# Altium footprint library connector.PcbLib: 172 footprints (part 9 of 11)
Each footprint in its own frame and in the unit in brackets; x right, y up, seen from the top. Pads: shape width x height; smd on the part's side, far side on the other; paste and mask are expansions set on the pad; w line width, h text height; cw(c..) or ccw(c..) is an arc to the next point about the centre after c.
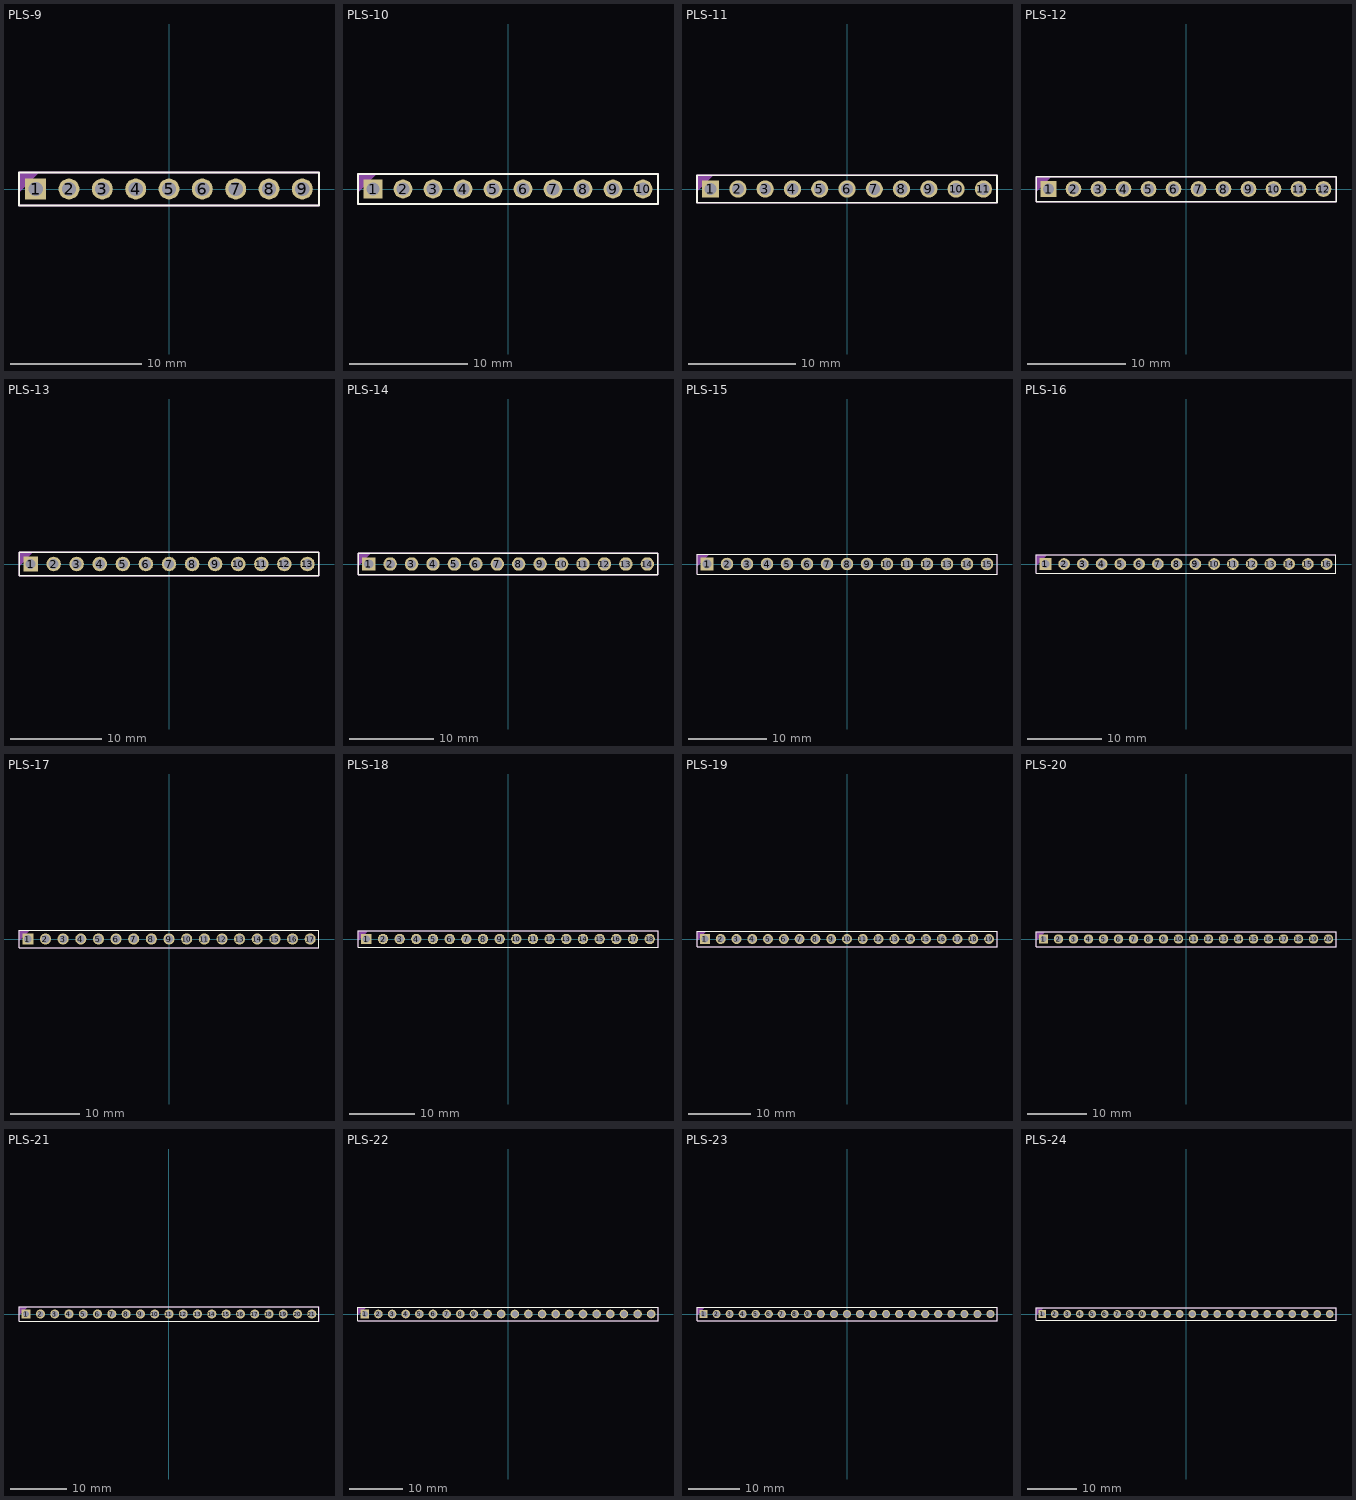
[diagram p8: the footprints below, top view; thin cyan lines are the x and y axes]

## PLS-9 [mm]
pads (9):
  rect 1.6x1.6 hole 1.1: 1(-10.16,0)
  round 1.6 hole 1.1: 2(-7.62,0) 3(-5.08,0) 4(-2.54,0) 5(0,0) 6(2.54,0) 7(5.08,0) 8(7.62,0) 9(10.16,0)
Top Overlay:
  lines w0.15: -11.43,-1.27 -11.43,1.27 11.43,1.27 11.43,-1.27 -11.43,-1.27
Mechanical 29:
  region: -11.43,1.27 -9.906,1.27 -11.43,-0.254
  lines w0.15: -11.43,-1.27 11.43,-1.27 11.43,1.27 -11.43,1.27 -11.43,-1.27
  text ".Designator" at -3.5,-0.3 h1
3D body "PLS-1.STEP": height 8.5, standoff -3, extent -11.43,-1.27 -8.89,1.27
3D body "PLS-1.STEP": height 8.5, standoff -3, extent -8.89,-1.27 -6.35,1.27
3D body "PLS-1.STEP": height 8.5, standoff -3, extent -6.35,-1.27 -3.81,1.27
3D body "PLS-1.STEP": height 8.5, standoff -3, extent -3.81,-1.27 -1.27,1.27
3D body "PLS-1.STEP": height 8.5, standoff -3, extent -1.27,-1.27 1.27,1.27
3D body "PLS-1.STEP": height 8.5, standoff -3, extent 1.27,-1.27 3.81,1.27
3D body "PLS-1.STEP": height 8.5, standoff -3, extent 3.81,-1.27 6.35,1.27
3D body "PLS-1.STEP": height 8.5, standoff -3, extent 6.35,-1.27 8.89,1.27
3D body "PLS-1.STEP": height 8.5, standoff -3, extent 8.89,-1.27 11.43,1.27

## PLS-10 [mm]
pads (10):
  rect 1.6x1.6 hole 1.1: 1(-11.43,0)
  round 1.6 hole 1.1: 2(-8.89,0) 3(-6.35,0) 4(-3.81,0) 5(-1.27,0) 6(1.27,0) 7(3.81,0) 8(6.35,0) 9(8.89,0) 10(11.43,0)
Top Overlay:
  lines w0.15: -12.7,-1.27 12.7,-1.27 12.7,1.27 -12.7,1.27 -12.7,-1.27
Mechanical 29:
  region: -12.7,1.27 -11.176,1.27 -12.7,-0.254
  lines w0.15: -12.7,-1.27 -12.7,1.27 12.7,1.27 12.7,-1.27 -12.7,-1.27
  text ".Designator" at -3.5,-0.8 h1
3D body "PLS-1.STEP": height 8.5, standoff -3, extent 10.16,-1.27 12.7,1.27
3D body "PLS-1.STEP": height 8.5, standoff -3, extent 7.62,-1.27 10.16,1.27
3D body "PLS-1.STEP": height 8.5, standoff -3, extent 5.08,-1.27 7.62,1.27
3D body "PLS-1.STEP": height 8.5, standoff -3, extent 2.54,-1.27 5.08,1.27
3D body "PLS-1.STEP": height 8.5, standoff -3, extent 0,-1.27 2.54,1.27
3D body "PLS-1.STEP": height 8.5, standoff -3, extent -2.54,-1.27 0,1.27
3D body "PLS-1.STEP": height 8.5, standoff -3, extent -5.08,-1.27 -2.54,1.27
3D body "PLS-1.STEP": height 8.5, standoff -3, extent -7.62,-1.27 -5.08,1.27
3D body "PLS-1.STEP": height 8.5, standoff -3, extent -10.16,-1.27 -7.62,1.27
3D body "PLS-1.STEP": height 8.5, standoff -3, extent -12.7,-1.27 -10.16,1.27

## PLS-11 [mm]
pads (11):
  rect 1.6x1.6 hole 1.1: 1(-12.7,0)
  round 1.6 hole 1.1: 2(-10.16,0) 3(-7.62,0) 4(-5.08,0) 5(-2.54,0) 6(0,0) 7(2.54,0) 8(5.08,0) 9(7.62,0) 10(10.16,0) 11(12.7,0)
Top Overlay:
  lines w0.15: -13.97,-1.27 13.97,-1.27 13.97,1.27 -13.97,1.27 -13.97,-1.27
Mechanical 29:
  region: -13.97,1.27 -12.446,1.27 -13.97,-0.254
  lines w0.15: -13.97,-1.27 -13.97,1.27 13.97,1.27 13.97,-1.27 -13.97,-1.27
  text ".Designator" at -3.5,-0.3 h1
3D body "PLS-1.STEP": height 8.5, standoff -3, extent 11.43,-1.27 13.97,1.27
3D body "PLS-1.STEP": height 8.5, standoff -3, extent 8.89,-1.27 11.43,1.27
3D body "PLS-1.STEP": height 8.5, standoff -3, extent 6.35,-1.27 8.89,1.27
3D body "PLS-1.STEP": height 8.5, standoff -3, extent 3.81,-1.27 6.35,1.27
3D body "PLS-1.STEP": height 8.5, standoff -3, extent 1.27,-1.27 3.81,1.27
3D body "PLS-1.STEP": height 8.5, standoff -3, extent -1.27,-1.27 1.27,1.27
3D body "PLS-1.STEP": height 8.5, standoff -3, extent -3.81,-1.27 -1.27,1.27
3D body "PLS-1.STEP": height 8.5, standoff -3, extent -6.35,-1.27 -3.81,1.27
3D body "PLS-1.STEP": height 8.5, standoff -3, extent -8.89,-1.27 -6.35,1.27
3D body "PLS-1.STEP": height 8.5, standoff -3, extent -11.43,-1.27 -8.89,1.27
3D body "PLS-1.STEP": height 8.5, standoff -3, extent -13.97,-1.27 -11.43,1.27

## PLS-12 [mm]
pads (12):
  rect 1.6x1.6 hole 1.1: 1(-13.97,0)
  round 1.6 hole 1.1: 2(-11.43,0) 3(-8.89,0) 4(-6.35,0) 5(-3.81,0) 6(-1.27,0) 7(1.27,0) 8(3.81,0) 9(6.35,0) 10(8.89,0) 11(11.43,0) 12(13.97,0)
Top Overlay:
  lines w0.15: -15.24,-1.27 15.24,-1.27 15.24,1.27 -15.24,1.27 -15.24,-1.27
Mechanical 29:
  region: -15.24,1.27 -13.716,1.27 -15.24,-0.254
  lines w0.15: -15.24,-1.27 -15.24,1.27 15.24,1.27 15.24,-1.27 -15.24,-1.27
  text ".Designator" at -3.5,-0.3 h1
3D body "PLS-1.STEP": height 8.5, standoff -3, extent 12.7,-1.27 15.24,1.27
3D body "PLS-1.STEP": height 8.5, standoff -3, extent 10.16,-1.27 12.7,1.27
3D body "PLS-1.STEP": height 8.5, standoff -3, extent 7.62,-1.27 10.16,1.27
3D body "PLS-1.STEP": height 8.5, standoff -3, extent 5.08,-1.27 7.62,1.27
3D body "PLS-1.STEP": height 8.5, standoff -3, extent 2.54,-1.27 5.08,1.27
3D body "PLS-1.STEP": height 8.5, standoff -3, extent 0,-1.27 2.54,1.27
3D body "PLS-1.STEP": height 8.5, standoff -3, extent -2.54,-1.27 0,1.27
3D body "PLS-1.STEP": height 8.5, standoff -3, extent -5.08,-1.27 -2.54,1.27
3D body "PLS-1.STEP": height 8.5, standoff -3, extent -7.62,-1.27 -5.08,1.27
3D body "PLS-1.STEP": height 8.5, standoff -3, extent -10.16,-1.27 -7.62,1.27
3D body "PLS-1.STEP": height 8.5, standoff -3, extent -12.7,-1.27 -10.16,1.27
3D body "PLS-1.STEP": height 8.5, standoff -3, extent -15.24,-1.27 -12.7,1.27

## PLS-13 [mm]
pads (13):
  rect 1.6x1.6 hole 1.1: 1(-15.24,0)
  round 1.6 hole 1.1: 2(-12.7,0) 3(-10.16,0) 4(-7.62,0) 5(-5.08,0) 6(-2.54,0) 7(0,0) 8(2.54,0) 9(5.08,0) 10(7.62,0) 11(10.16,0) 12(12.7,0) 13(15.24,0)
Top Overlay:
  lines w0.15: -16.51,-1.27 16.51,-1.27 16.51,1.27 -16.51,1.27 -16.51,-1.27
Mechanical 29:
  region: -16.51,1.27 -14.986,1.27 -16.51,-0.254
  lines w0.15: -16.51,-1.27 -16.51,1.27 16.51,1.27 16.51,-1.27 -16.51,-1.27
  text ".Designator" at -3.5,-0.3 h1
3D body "PLS-1.STEP": height 8.5, standoff -3, extent 13.97,-1.27 16.51,1.27
3D body "PLS-1.STEP": height 8.5, standoff -3, extent 11.43,-1.27 13.97,1.27
3D body "PLS-1.STEP": height 8.5, standoff -3, extent 8.89,-1.27 11.43,1.27
3D body "PLS-1.STEP": height 8.5, standoff -3, extent 6.35,-1.27 8.89,1.27
3D body "PLS-1.STEP": height 8.5, standoff -3, extent 3.81,-1.27 6.35,1.27
3D body "PLS-1.STEP": height 8.5, standoff -3, extent 1.27,-1.27 3.81,1.27
3D body "PLS-1.STEP": height 8.5, standoff -3, extent -1.27,-1.27 1.27,1.27
3D body "PLS-1.STEP": height 8.5, standoff -3, extent -3.81,-1.27 -1.27,1.27
3D body "PLS-1.STEP": height 8.5, standoff -3, extent -6.35,-1.27 -3.81,1.27
3D body "PLS-1.STEP": height 8.5, standoff -3, extent -8.89,-1.27 -6.35,1.27
3D body "PLS-1.STEP": height 8.5, standoff -3, extent -11.43,-1.27 -8.89,1.27
3D body "PLS-1.STEP": height 8.5, standoff -3, extent -13.97,-1.27 -11.43,1.27
3D body "PLS-1.STEP": height 8.5, standoff -3, extent -16.51,-1.27 -13.97,1.27

## PLS-14 [mm]
pads (14):
  rect 1.6x1.6 hole 1.1: 1(-16.51,0)
  round 1.6 hole 1.1: 2(-13.97,0) 3(-11.43,0) 4(-8.89,0) 5(-6.35,0) 6(-3.81,0) 7(-1.27,0) 8(1.27,0) 9(3.81,0) 10(6.35,0) 11(8.89,0) 12(11.43,0) 13(13.97,0) 14(16.51,0)
Top Overlay:
  lines w0.15: -17.78,-1.27 -17.78,1.27 17.78,1.27 17.78,-1.27 -17.78,-1.27
Mechanical 29:
  region: -17.78,1.27 -16.256,1.27 -17.78,-0.254
  lines w0.15: -17.78,-1.27 17.78,-1.27 17.78,1.27 -17.78,1.27 -17.78,-1.27
  text ".Designator" at -3.5,-0.3 h1
3D body "PLS-1.STEP": height 8.5, standoff -3, extent -17.78,-1.27 -15.24,1.27
3D body "PLS-1.STEP": height 8.5, standoff -3, extent -15.24,-1.27 -12.7,1.27
3D body "PLS-1.STEP": height 8.5, standoff -3, extent -12.7,-1.27 -10.16,1.27
3D body "PLS-1.STEP": height 8.5, standoff -3, extent -10.16,-1.27 -7.62,1.27
3D body "PLS-1.STEP": height 8.5, standoff -3, extent -7.62,-1.27 -5.08,1.27
3D body "PLS-1.STEP": height 8.5, standoff -3, extent -5.08,-1.27 -2.54,1.27
3D body "PLS-1.STEP": height 8.5, standoff -3, extent -2.54,-1.27 0,1.27
3D body "PLS-1.STEP": height 8.5, standoff -3, extent 0,-1.27 2.54,1.27
3D body "PLS-1.STEP": height 8.5, standoff -3, extent 2.54,-1.27 5.08,1.27
3D body "PLS-1.STEP": height 8.5, standoff -3, extent 5.08,-1.27 7.62,1.27
3D body "PLS-1.STEP": height 8.5, standoff -3, extent 7.62,-1.27 10.16,1.27
3D body "PLS-1.STEP": height 8.5, standoff -3, extent 10.16,-1.27 12.7,1.27
3D body "PLS-1.STEP": height 8.5, standoff -3, extent 12.7,-1.27 15.24,1.27
3D body "PLS-1.STEP": height 8.5, standoff -3, extent 15.24,-1.27 17.78,1.27

## PLS-15 [mm]
pads (15):
  rect 1.6x1.6 hole 1.1: 1(-17.78,0)
  round 1.6 hole 1.1: 2(-15.24,0) 3(-12.7,0) 4(-10.16,0) 5(-7.62,0) 6(-5.08,0) 7(-2.54,0) 8(0,0) 9(2.54,0) 10(5.08,0) 11(7.62,0) 12(10.16,0) 13(12.7,0) 14(15.24,0) 15(17.78,0)
Top Overlay:
  lines w0.15: -19.05,-1.27 -19.05,1.27 19.05,1.27 19.05,-1.27 -19.05,-1.27
Mechanical 29:
  region: -19.05,1.27 -17.526,1.27 -19.05,-0.254
  lines w0.15: -19.05,-1.27 19.05,-1.27 19.05,1.27 -19.05,1.27 -19.05,-1.27
  text ".Designator" at -3.5,-0.3 h1
3D body "PLS-1.STEP": height 8.5, standoff -3, extent -19.05,-1.27 -16.51,1.27
3D body "PLS-1.STEP": height 8.5, standoff -3, extent -16.51,-1.27 -13.97,1.27
3D body "PLS-1.STEP": height 8.5, standoff -3, extent -13.97,-1.27 -11.43,1.27
3D body "PLS-1.STEP": height 8.5, standoff -3, extent -11.43,-1.27 -8.89,1.27
3D body "PLS-1.STEP": height 8.5, standoff -3, extent -8.89,-1.27 -6.35,1.27
3D body "PLS-1.STEP": height 8.5, standoff -3, extent -6.35,-1.27 -3.81,1.27
3D body "PLS-1.STEP": height 8.5, standoff -3, extent -3.81,-1.27 -1.27,1.27
3D body "PLS-1.STEP": height 8.5, standoff -3, extent -1.27,-1.27 1.27,1.27
3D body "PLS-1.STEP": height 8.5, standoff -3, extent 1.27,-1.27 3.81,1.27
3D body "PLS-1.STEP": height 8.5, standoff -3, extent 3.81,-1.27 6.35,1.27
3D body "PLS-1.STEP": height 8.5, standoff -3, extent 6.35,-1.27 8.89,1.27
3D body "PLS-1.STEP": height 8.5, standoff -3, extent 8.89,-1.27 11.43,1.27
3D body "PLS-1.STEP": height 8.5, standoff -3, extent 11.43,-1.27 13.97,1.27
3D body "PLS-1.STEP": height 8.5, standoff -3, extent 13.97,-1.27 16.51,1.27
3D body "PLS-1.STEP": height 8.5, standoff -3, extent 16.51,-1.27 19.05,1.27

## PLS-16 [mm]
pads (16):
  rect 1.6x1.6 hole 1.1: 1(-19.05,0)
  round 1.6 hole 1.1: 2(-16.51,0) 3(-13.97,0) 4(-11.43,0) 5(-8.89,0) 6(-6.35,0) 7(-3.81,0) 8(-1.27,0) 9(1.27,0) 10(3.81,0) 11(6.35,0) 12(8.89,0) 13(11.43,0) 14(13.97,0) 15(16.51,0) 16(19.05,0)
Top Overlay:
  lines w0.15: -20.32,-1.27 20.32,-1.27 20.32,1.27 -20.32,1.27 -20.32,-1.27
Mechanical 29:
  region: -20.32,1.27 -18.796,1.27 -20.32,-0.254
  lines w0.15: -20.32,-1.27 -20.32,1.27 20.32,1.27 20.32,-1.27 -20.32,-1.27
  text ".Designator" at -3.5,-0.3 h1
3D body "PLS-1.STEP": height 8.5, standoff -3, extent 17.78,-1.27 20.32,1.27
3D body "PLS-1.STEP": height 8.5, standoff -3, extent 15.24,-1.27 17.78,1.27
3D body "PLS-1.STEP": height 8.5, standoff -3, extent 12.7,-1.27 15.24,1.27
3D body "PLS-1.STEP": height 8.5, standoff -3, extent 10.16,-1.27 12.7,1.27
3D body "PLS-1.STEP": height 8.5, standoff -3, extent 7.62,-1.27 10.16,1.27
3D body "PLS-1.STEP": height 8.5, standoff -3, extent 5.08,-1.27 7.62,1.27
3D body "PLS-1.STEP": height 8.5, standoff -3, extent 2.54,-1.27 5.08,1.27
3D body "PLS-1.STEP": height 8.5, standoff -3, extent 0,-1.27 2.54,1.27
3D body "PLS-1.STEP": height 8.5, standoff -3, extent -2.54,-1.27 0,1.27
3D body "PLS-1.STEP": height 8.5, standoff -3, extent -5.08,-1.27 -2.54,1.27
3D body "PLS-1.STEP": height 8.5, standoff -3, extent -7.62,-1.27 -5.08,1.27
3D body "PLS-1.STEP": height 8.5, standoff -3, extent -10.16,-1.27 -7.62,1.27
3D body "PLS-1.STEP": height 8.5, standoff -3, extent -12.7,-1.27 -10.16,1.27
3D body "PLS-1.STEP": height 8.5, standoff -3, extent -15.24,-1.27 -12.7,1.27
3D body "PLS-1.STEP": height 8.5, standoff -3, extent -17.78,-1.27 -15.24,1.27
3D body "PLS-1.STEP": height 8.5, standoff -3, extent -20.32,-1.27 -17.78,1.27

## PLS-17 [mm]
pads (17):
  rect 1.6x1.6 hole 1.1: 1(-20.32,0)
  round 1.6 hole 1.1: 2(-17.78,0) 3(-15.24,0) 4(-12.7,0) 5(-10.16,0) 6(-7.62,0) 7(-5.08,0) 8(-2.54,0) 9(0,0) 10(2.54,0) 11(5.08,0) 12(7.62,0) 13(10.16,0) 14(12.7,0) 15(15.24,0) 16(17.78,0) 17(20.32,0)
Top Overlay:
  lines w0.15: -21.59,-1.27 21.59,-1.27 21.59,1.27 -21.59,1.27 -21.59,-1.27
Mechanical 29:
  region: -21.59,1.27 -20.066,1.27 -21.59,-0.254
  lines w0.15: -21.59,-1.27 -21.59,1.27 21.59,1.27 21.59,-1.27 -21.59,-1.27
  text ".Designator" at -3.5,-0.3 h1
3D body "PLS-1.STEP": height 8.5, standoff -3, extent 19.05,-1.27 21.59,1.27
3D body "PLS-1.STEP": height 8.5, standoff -3, extent 16.51,-1.27 19.05,1.27
3D body "PLS-1.STEP": height 8.5, standoff -3, extent 13.97,-1.27 16.51,1.27
3D body "PLS-1.STEP": height 8.5, standoff -3, extent 11.43,-1.27 13.97,1.27
3D body "PLS-1.STEP": height 8.5, standoff -3, extent 8.89,-1.27 11.43,1.27
3D body "PLS-1.STEP": height 8.5, standoff -3, extent 6.35,-1.27 8.89,1.27
3D body "PLS-1.STEP": height 8.5, standoff -3, extent 3.81,-1.27 6.35,1.27
3D body "PLS-1.STEP": height 8.5, standoff -3, extent 1.27,-1.27 3.81,1.27
3D body "PLS-1.STEP": height 8.5, standoff -3, extent -1.27,-1.27 1.27,1.27
3D body "PLS-1.STEP": height 8.5, standoff -3, extent -3.81,-1.27 -1.27,1.27
3D body "PLS-1.STEP": height 8.5, standoff -3, extent -6.35,-1.27 -3.81,1.27
3D body "PLS-1.STEP": height 8.5, standoff -3, extent -8.89,-1.27 -6.35,1.27
3D body "PLS-1.STEP": height 8.5, standoff -3, extent -11.43,-1.27 -8.89,1.27
3D body "PLS-1.STEP": height 8.5, standoff -3, extent -13.97,-1.27 -11.43,1.27
3D body "PLS-1.STEP": height 8.5, standoff -3, extent -16.51,-1.27 -13.97,1.27
3D body "PLS-1.STEP": height 8.5, standoff -3, extent -19.05,-1.27 -16.51,1.27
3D body "PLS-1.STEP": height 8.5, standoff -3, extent -21.59,-1.27 -19.05,1.27

## PLS-18 [mm]
pads (18):
  rect 1.6x1.6 hole 1.1: 1(-21.59,0)
  round 1.6 hole 1.1: 2(-19.05,0) 3(-16.51,0) 4(-13.97,0) 5(-11.43,0) 6(-8.89,0) 7(-6.35,0) 8(-3.81,0) 9(-1.27,0) 10(1.27,0) 11(3.81,0) 12(6.35,0) 13(8.89,0) 14(11.43,0) 15(13.97,0) 16(16.51,0) 17(19.05,0) 18(21.59,0)
Top Overlay:
  lines w0.15: -22.86,-1.27 22.86,-1.27 22.86,1.27 -22.86,1.27 -22.86,-1.27
Mechanical 29:
  region: -22.86,1.27 -21.336,1.27 -22.86,-0.254
  lines w0.15: -22.86,-1.27 -22.86,1.27 22.86,1.27 22.86,-1.27 -22.86,-1.27
  text ".Designator" at -3.5,-0.3 h1
3D body "PLS-1.STEP": height 8.5, standoff -3, extent 20.32,-1.27 22.86,1.27
3D body "PLS-1.STEP": height 8.5, standoff -3, extent 17.78,-1.27 20.32,1.27
3D body "PLS-1.STEP": height 8.5, standoff -3, extent 15.24,-1.27 17.78,1.27
3D body "PLS-1.STEP": height 8.5, standoff -3, extent 12.7,-1.27 15.24,1.27
3D body "PLS-1.STEP": height 8.5, standoff -3, extent 10.16,-1.27 12.7,1.27
3D body "PLS-1.STEP": height 8.5, standoff -3, extent 7.62,-1.27 10.16,1.27
3D body "PLS-1.STEP": height 8.5, standoff -3, extent 5.08,-1.27 7.62,1.27
3D body "PLS-1.STEP": height 8.5, standoff -3, extent 2.54,-1.27 5.08,1.27
3D body "PLS-1.STEP": height 8.5, standoff -3, extent 0,-1.27 2.54,1.27
3D body "PLS-1.STEP": height 8.5, standoff -3, extent -2.54,-1.27 0,1.27
3D body "PLS-1.STEP": height 8.5, standoff -3, extent -5.08,-1.27 -2.54,1.27
3D body "PLS-1.STEP": height 8.5, standoff -3, extent -7.62,-1.27 -5.08,1.27
3D body "PLS-1.STEP": height 8.5, standoff -3, extent -10.16,-1.27 -7.62,1.27
3D body "PLS-1.STEP": height 8.5, standoff -3, extent -12.7,-1.27 -10.16,1.27
3D body "PLS-1.STEP": height 8.5, standoff -3, extent -15.24,-1.27 -12.7,1.27
3D body "PLS-1.STEP": height 8.5, standoff -3, extent -17.78,-1.27 -15.24,1.27
3D body "PLS-1.STEP": height 8.5, standoff -3, extent -20.32,-1.27 -17.78,1.27
3D body "PLS-1.STEP": height 8.5, standoff -3, extent -22.86,-1.27 -20.32,1.27

## PLS-19 [mm]
pads (19):
  rect 1.6x1.6 hole 1.1: 1(-22.86,0)
  round 1.6 hole 1.1: 2(-20.32,0) 3(-17.78,0) 4(-15.24,0) 5(-12.7,0) 6(-10.16,0) 7(-7.62,0) 8(-5.08,0) 9(-2.54,0) 10(0,0) 11(2.54,0) 12(5.08,0) 13(7.62,0) 14(10.16,0) 15(12.7,0) 16(15.24,0) 17(17.78,0) 18(20.32,0) 19(22.86,0)
Top Overlay:
  lines w0.15: -24.13,-1.27 -24.13,1.27 24.13,1.27 24.13,-1.27 -24.13,-1.27
Mechanical 29:
  region: -24.13,1.27 -22.606,1.27 -24.13,-0.254
  lines w0.15: -24.13,-1.27 24.13,-1.27 24.13,1.27 -24.13,1.27 -24.13,-1.27
  text ".Designator" at -3.5,-0.3 h1
3D body "PLS-1.STEP": height 8.5, standoff -3, extent -24.13,-1.27 -21.59,1.27
3D body "PLS-1.STEP": height 8.5, standoff -3, extent -21.59,-1.27 -19.05,1.27
3D body "PLS-1.STEP": height 8.5, standoff -3, extent -19.05,-1.27 -16.51,1.27
3D body "PLS-1.STEP": height 8.5, standoff -3, extent -16.51,-1.27 -13.97,1.27
3D body "PLS-1.STEP": height 8.5, standoff -3, extent -13.97,-1.27 -11.43,1.27
3D body "PLS-1.STEP": height 8.5, standoff -3, extent -11.43,-1.27 -8.89,1.27
3D body "PLS-1.STEP": height 8.5, standoff -3, extent -8.89,-1.27 -6.35,1.27
3D body "PLS-1.STEP": height 8.5, standoff -3, extent -6.35,-1.27 -3.81,1.27
3D body "PLS-1.STEP": height 8.5, standoff -3, extent -3.81,-1.27 -1.27,1.27
3D body "PLS-1.STEP": height 8.5, standoff -3, extent -1.27,-1.27 1.27,1.27
3D body "PLS-1.STEP": height 8.5, standoff -3, extent 1.27,-1.27 3.81,1.27
3D body "PLS-1.STEP": height 8.5, standoff -3, extent 3.81,-1.27 6.35,1.27
3D body "PLS-1.STEP": height 8.5, standoff -3, extent 6.35,-1.27 8.89,1.27
3D body "PLS-1.STEP": height 8.5, standoff -3, extent 8.89,-1.27 11.43,1.27
3D body "PLS-1.STEP": height 8.5, standoff -3, extent 11.43,-1.27 13.97,1.27
3D body "PLS-1.STEP": height 8.5, standoff -3, extent 13.97,-1.27 16.51,1.27
3D body "PLS-1.STEP": height 8.5, standoff -3, extent 16.51,-1.27 19.05,1.27
3D body "PLS-1.STEP": height 8.5, standoff -3, extent 19.05,-1.27 21.59,1.27
3D body "PLS-1.STEP": height 8.5, standoff -3, extent 21.59,-1.27 24.13,1.27

## PLS-20 [mm]
pads (20):
  rect 1.6x1.6 hole 1.1: 1(-24.13,0)
  round 1.6 hole 1.1: 2(-21.59,0) 3(-19.05,0) 4(-16.51,0) 5(-13.97,0) 6(-11.43,0) 7(-8.89,0) 8(-6.35,0) 9(-3.81,0) 10(-1.27,0) 11(1.27,0) 12(3.81,0) 13(6.35,0) 14(8.89,0) 15(11.43,0) 16(13.97,0) 17(16.51,0) 18(19.05,0) 19(21.59,0) 20(24.13,0)
Top Overlay:
  lines w0.15: -25.4,-1.27 25.4,-1.27 25.4,1.27 -25.4,1.27 -25.4,-1.27
Mechanical 29:
  region: -25.4,1.27 -23.876,1.27 -25.4,-0.254
  lines w0.15: -25.4,-1.27 -25.4,1.27 25.4,1.27 25.4,-1.27 -25.4,-1.27
  text ".Designator" at -3.5,-0.3 h1
3D body "PLS-1.STEP": height 8.5, standoff -3, extent 22.86,-1.27 25.4,1.27
3D body "PLS-1.STEP": height 8.5, standoff -3, extent 20.32,-1.27 22.86,1.27
3D body "PLS-1.STEP": height 8.5, standoff -3, extent 17.78,-1.27 20.32,1.27
3D body "PLS-1.STEP": height 8.5, standoff -3, extent 15.24,-1.27 17.78,1.27
3D body "PLS-1.STEP": height 8.5, standoff -3, extent 12.7,-1.27 15.24,1.27
3D body "PLS-1.STEP": height 8.5, standoff -3, extent 10.16,-1.27 12.7,1.27
3D body "PLS-1.STEP": height 8.5, standoff -3, extent 7.62,-1.27 10.16,1.27
3D body "PLS-1.STEP": height 8.5, standoff -3, extent 5.08,-1.27 7.62,1.27
3D body "PLS-1.STEP": height 8.5, standoff -3, extent 2.54,-1.27 5.08,1.27
3D body "PLS-1.STEP": height 8.5, standoff -3, extent 0,-1.27 2.54,1.27
3D body "PLS-1.STEP": height 8.5, standoff -3, extent -2.54,-1.27 0,1.27
3D body "PLS-1.STEP": height 8.5, standoff -3, extent -5.08,-1.27 -2.54,1.27
3D body "PLS-1.STEP": height 8.5, standoff -3, extent -7.62,-1.27 -5.08,1.27
3D body "PLS-1.STEP": height 8.5, standoff -3, extent -10.16,-1.27 -7.62,1.27
3D body "PLS-1.STEP": height 8.5, standoff -3, extent -12.7,-1.27 -10.16,1.27
3D body "PLS-1.STEP": height 8.5, standoff -3, extent -15.24,-1.27 -12.7,1.27
3D body "PLS-1.STEP": height 8.5, standoff -3, extent -17.78,-1.27 -15.24,1.27
3D body "PLS-1.STEP": height 8.5, standoff -3, extent -20.32,-1.27 -17.78,1.27
3D body "PLS-1.STEP": height 8.5, standoff -3, extent -22.86,-1.27 -20.32,1.27
3D body "PLS-1.STEP": height 8.5, standoff -3, extent -25.4,-1.27 -22.86,1.27

## PLS-21 [mm]
pads (21):
  rect 1.6x1.6 hole 1.1: 1(-25.4,0)
  round 1.6 hole 1.1: 2(-22.86,0) 3(-20.32,0) 4(-17.78,0) 5(-15.24,0) 6(-12.7,0) 7(-10.16,0) 8(-7.62,0) 9(-5.08,0) 10(-2.54,0) 11(0,0) 12(2.54,0) 13(5.08,0) 14(7.62,0) 15(10.16,0) 16(12.7,0) 17(15.24,0) 18(17.78,0) 19(20.32,0) 20(22.86,0) 21(25.4,0)
Top Overlay:
  lines w0.15: -26.67,-1.27 26.67,-1.27 26.67,1.27 -26.67,1.27 -26.67,-1.27
Mechanical 29:
  region: -26.67,1.27 -25.146,1.27 -26.67,-0.254
  lines w0.15: -26.67,-1.27 -26.67,1.27 26.67,1.27 26.67,-1.27 -26.67,-1.27
  text ".Designator" at -3.5,-0.3 h1
3D body "PLS-1.STEP": height 8.5, standoff -3, extent 24.13,-1.27 26.67,1.27
3D body "PLS-1.STEP": height 8.5, standoff -3, extent 21.59,-1.27 24.13,1.27
3D body "PLS-1.STEP": height 8.5, standoff -3, extent 19.05,-1.27 21.59,1.27
3D body "PLS-1.STEP": height 8.5, standoff -3, extent 16.51,-1.27 19.05,1.27
3D body "PLS-1.STEP": height 8.5, standoff -3, extent 13.97,-1.27 16.51,1.27
3D body "PLS-1.STEP": height 8.5, standoff -3, extent 11.43,-1.27 13.97,1.27
3D body "PLS-1.STEP": height 8.5, standoff -3, extent 8.89,-1.27 11.43,1.27
3D body "PLS-1.STEP": height 8.5, standoff -3, extent 6.35,-1.27 8.89,1.27
3D body "PLS-1.STEP": height 8.5, standoff -3, extent 3.81,-1.27 6.35,1.27
3D body "PLS-1.STEP": height 8.5, standoff -3, extent 1.27,-1.27 3.81,1.27
3D body "PLS-1.STEP": height 8.5, standoff -3, extent -1.27,-1.27 1.27,1.27
3D body "PLS-1.STEP": height 8.5, standoff -3, extent -3.81,-1.27 -1.27,1.27
3D body "PLS-1.STEP": height 8.5, standoff -3, extent -6.35,-1.27 -3.81,1.27
3D body "PLS-1.STEP": height 8.5, standoff -3, extent -8.89,-1.27 -6.35,1.27
3D body "PLS-1.STEP": height 8.5, standoff -3, extent -11.43,-1.27 -8.89,1.27
3D body "PLS-1.STEP": height 8.5, standoff -3, extent -13.97,-1.27 -11.43,1.27
3D body "PLS-1.STEP": height 8.5, standoff -3, extent -16.51,-1.27 -13.97,1.27
3D body "PLS-1.STEP": height 8.5, standoff -3, extent -19.05,-1.27 -16.51,1.27
3D body "PLS-1.STEP": height 8.5, standoff -3, extent -21.59,-1.27 -19.05,1.27
3D body "PLS-1.STEP": height 8.5, standoff -3, extent -24.13,-1.27 -21.59,1.27
3D body "PLS-1.STEP": height 8.5, standoff -3, extent -26.67,-1.27 -24.13,1.27

## PLS-22 [mm]
pads (22):
  rect 1.6x1.6 hole 1.1: 1(-26.67,0)
  round 1.6 hole 1.1: 2(-24.13,0) 3(-21.59,0) 4(-19.05,0) 5(-16.51,0) 6(-13.97,0) 7(-11.43,0) 8(-8.89,0) 9(-6.35,0) 10(-3.81,0) 11(-1.27,0) 12(1.27,0) 13(3.81,0) 14(6.35,0) 15(8.89,0) 16(11.43,0) 17(13.97,0) 18(16.51,0) 19(19.05,0) 20(21.59,0) 21(24.13,0) 22(26.67,0)
Top Overlay:
  lines w0.15: -27.94,-1.27 27.94,-1.27 27.94,1.27 -27.94,1.27 -27.94,-1.27
Mechanical 29:
  region: -27.94,1.27 -26.416,1.27 -27.94,-0.254
  lines w0.15: -27.94,-1.27 -27.94,1.27 27.94,1.27 27.94,-1.27 -27.94,-1.27
  text ".Designator" at -3.5,-0.3 h1
3D body "PLS-1.STEP": height 8.5, standoff -3, extent 25.4,-1.27 27.94,1.27
3D body "PLS-1.STEP": height 8.5, standoff -3, extent 22.86,-1.27 25.4,1.27
3D body "PLS-1.STEP": height 8.5, standoff -3, extent 20.32,-1.27 22.86,1.27
3D body "PLS-1.STEP": height 8.5, standoff -3, extent 17.78,-1.27 20.32,1.27
3D body "PLS-1.STEP": height 8.5, standoff -3, extent 15.24,-1.27 17.78,1.27
3D body "PLS-1.STEP": height 8.5, standoff -3, extent 12.7,-1.27 15.24,1.27
3D body "PLS-1.STEP": height 8.5, standoff -3, extent 10.16,-1.27 12.7,1.27
3D body "PLS-1.STEP": height 8.5, standoff -3, extent 7.62,-1.27 10.16,1.27
3D body "PLS-1.STEP": height 8.5, standoff -3, extent 5.08,-1.27 7.62,1.27
3D body "PLS-1.STEP": height 8.5, standoff -3, extent 2.54,-1.27 5.08,1.27
3D body "PLS-1.STEP": height 8.5, standoff -3, extent 0,-1.27 2.54,1.27
3D body "PLS-1.STEP": height 8.5, standoff -3, extent -2.54,-1.27 0,1.27
3D body "PLS-1.STEP": height 8.5, standoff -3, extent -5.08,-1.27 -2.54,1.27
3D body "PLS-1.STEP": height 8.5, standoff -3, extent -7.62,-1.27 -5.08,1.27
3D body "PLS-1.STEP": height 8.5, standoff -3, extent -10.16,-1.27 -7.62,1.27
3D body "PLS-1.STEP": height 8.5, standoff -3, extent -12.7,-1.27 -10.16,1.27
3D body "PLS-1.STEP": height 8.5, standoff -3, extent -15.24,-1.27 -12.7,1.27
3D body "PLS-1.STEP": height 8.5, standoff -3, extent -17.78,-1.27 -15.24,1.27
3D body "PLS-1.STEP": height 8.5, standoff -3, extent -20.32,-1.27 -17.78,1.27
3D body "PLS-1.STEP": height 8.5, standoff -3, extent -22.86,-1.27 -20.32,1.27
3D body "PLS-1.STEP": height 8.5, standoff -3, extent -25.4,-1.27 -22.86,1.27
3D body "PLS-1.STEP": height 8.5, standoff -3, extent -27.94,-1.27 -25.4,1.27

## PLS-23 [mm]
pads (23):
  rect 1.6x1.6 hole 1.1: 1(-27.94,0)
  round 1.6 hole 1.1: 2(-25.4,0) 3(-22.86,0) 4(-20.32,0) 5(-17.78,0) 6(-15.24,0) 7(-12.7,0) 8(-10.16,0) 9(-7.62,0) 10(-5.08,0) 11(-2.54,0) 12(0,0) 13(2.54,0) 14(5.08,0) 15(7.62,0) 16(10.16,0) 17(12.7,0) 18(15.24,0) 19(17.78,0) 20(20.32,0) 21(22.86,0) 22(25.4,0) 23(27.94,0)
Top Overlay:
  lines w0.15: -29.21,-1.27 -29.21,1.27 29.21,1.27 29.21,-1.27 -29.21,-1.27
Mechanical 29:
  region: -29.21,1.27 -27.686,1.27 -29.21,-0.254
  lines w0.15: -29.21,-1.27 29.21,-1.27 29.21,1.27 -29.21,1.27 -29.21,-1.27
  text ".Designator" at -3.5,-0.3 h1
3D body "PLS-1.STEP": height 8.5, standoff -3, extent -29.21,-1.27 -26.67,1.27
3D body "PLS-1.STEP": height 8.5, standoff -3, extent -26.67,-1.27 -24.13,1.27
3D body "PLS-1.STEP": height 8.5, standoff -3, extent -24.13,-1.27 -21.59,1.27
3D body "PLS-1.STEP": height 8.5, standoff -3, extent -21.59,-1.27 -19.05,1.27
3D body "PLS-1.STEP": height 8.5, standoff -3, extent -19.05,-1.27 -16.51,1.27
3D body "PLS-1.STEP": height 8.5, standoff -3, extent -16.51,-1.27 -13.97,1.27
3D body "PLS-1.STEP": height 8.5, standoff -3, extent -13.97,-1.27 -11.43,1.27
3D body "PLS-1.STEP": height 8.5, standoff -3, extent -11.43,-1.27 -8.89,1.27
3D body "PLS-1.STEP": height 8.5, standoff -3, extent -8.89,-1.27 -6.35,1.27
3D body "PLS-1.STEP": height 8.5, standoff -3, extent -6.35,-1.27 -3.81,1.27
3D body "PLS-1.STEP": height 8.5, standoff -3, extent -3.81,-1.27 -1.27,1.27
3D body "PLS-1.STEP": height 8.5, standoff -3, extent -1.27,-1.27 1.27,1.27
3D body "PLS-1.STEP": height 8.5, standoff -3, extent 1.27,-1.27 3.81,1.27
3D body "PLS-1.STEP": height 8.5, standoff -3, extent 3.81,-1.27 6.35,1.27
3D body "PLS-1.STEP": height 8.5, standoff -3, extent 6.35,-1.27 8.89,1.27
3D body "PLS-1.STEP": height 8.5, standoff -3, extent 8.89,-1.27 11.43,1.27
3D body "PLS-1.STEP": height 8.5, standoff -3, extent 11.43,-1.27 13.97,1.27
3D body "PLS-1.STEP": height 8.5, standoff -3, extent 13.97,-1.27 16.51,1.27
3D body "PLS-1.STEP": height 8.5, standoff -3, extent 16.51,-1.27 19.05,1.27
3D body "PLS-1.STEP": height 8.5, standoff -3, extent 19.05,-1.27 21.59,1.27
3D body "PLS-1.STEP": height 8.5, standoff -3, extent 21.59,-1.27 24.13,1.27
3D body "PLS-1.STEP": height 8.5, standoff -3, extent 24.13,-1.27 26.67,1.27
3D body "PLS-1.STEP": height 8.5, standoff -3, extent 26.67,-1.27 29.21,1.27

## PLS-24 [mm]
pads (24):
  rect 1.6x1.6 hole 1.1: 1(-29.21,0)
  round 1.6 hole 1.1: 2(-26.67,0) 3(-24.13,0) 4(-21.59,0) 5(-19.05,0) 6(-16.51,0) 7(-13.97,0) 8(-11.43,0) 9(-8.89,0) 10(-6.35,0) 11(-3.81,0) 12(-1.27,0) 13(1.27,0) 14(3.81,0) 15(6.35,0) 16(8.89,0) 17(11.43,0) 18(13.97,0) 19(16.51,0) 20(19.05,0) 21(21.59,0) 22(24.13,0) 23(26.67,0) 24(29.21,0)
Top Overlay:
  lines w0.15: -30.48,-1.27 30.48,-1.27 30.48,1.27 -30.48,1.27 -30.48,-1.27
Mechanical 29:
  region: -30.48,1.27 -28.956,1.27 -30.48,-0.254
  lines w0.15: -30.48,-1.27 -30.48,1.27 30.48,1.27 30.48,-1.27 -30.48,-1.27
  text ".Designator" at -3.5,-0.3 h1
3D body "PLS-1.STEP": height 8.5, standoff -3, extent 27.94,-1.27 30.48,1.27
3D body "PLS-1.STEP": height 8.5, standoff -3, extent 25.4,-1.27 27.94,1.27
3D body "PLS-1.STEP": height 8.5, standoff -3, extent 22.86,-1.27 25.4,1.27
3D body "PLS-1.STEP": height 8.5, standoff -3, extent 20.32,-1.27 22.86,1.27
3D body "PLS-1.STEP": height 8.5, standoff -3, extent 17.78,-1.27 20.32,1.27
3D body "PLS-1.STEP": height 8.5, standoff -3, extent 15.24,-1.27 17.78,1.27
3D body "PLS-1.STEP": height 8.5, standoff -3, extent 12.7,-1.27 15.24,1.27
3D body "PLS-1.STEP": height 8.5, standoff -3, extent 10.16,-1.27 12.7,1.27
3D body "PLS-1.STEP": height 8.5, standoff -3, extent 7.62,-1.27 10.16,1.27
3D body "PLS-1.STEP": height 8.5, standoff -3, extent 5.08,-1.27 7.62,1.27
3D body "PLS-1.STEP": height 8.5, standoff -3, extent 2.54,-1.27 5.08,1.27
3D body "PLS-1.STEP": height 8.5, standoff -3, extent 0,-1.27 2.54,1.27
3D body "PLS-1.STEP": height 8.5, standoff -3, extent -2.54,-1.27 0,1.27
3D body "PLS-1.STEP": height 8.5, standoff -3, extent -5.08,-1.27 -2.54,1.27
3D body "PLS-1.STEP": height 8.5, standoff -3, extent -7.62,-1.27 -5.08,1.27
3D body "PLS-1.STEP": height 8.5, standoff -3, extent -10.16,-1.27 -7.62,1.27
3D body "PLS-1.STEP": height 8.5, standoff -3, extent -12.7,-1.27 -10.16,1.27
3D body "PLS-1.STEP": height 8.5, standoff -3, extent -15.24,-1.27 -12.7,1.27
3D body "PLS-1.STEP": height 8.5, standoff -3, extent -17.78,-1.27 -15.24,1.27
3D body "PLS-1.STEP": height 8.5, standoff -3, extent -20.32,-1.27 -17.78,1.27
3D body "PLS-1.STEP": height 8.5, standoff -3, extent -22.86,-1.27 -20.32,1.27
3D body "PLS-1.STEP": height 8.5, standoff -3, extent -25.4,-1.27 -22.86,1.27
3D body "PLS-1.STEP": height 8.5, standoff -3, extent -27.94,-1.27 -25.4,1.27
3D body "PLS-1.STEP": height 8.5, standoff -3, extent -30.48,-1.27 -27.94,1.27